# Altium footprint library ic.PcbLib: 129 footprints (part 2 of 9)
Each footprint in its own frame and in the unit in brackets; x right, y up, seen from the top. Pads: shape width x height; smd on the part's side, far side on the other; paste and mask are expansions set on the pad; w line width, h text height; cw(c..) or ccw(c..) is an arc to the next point about the centre after c.
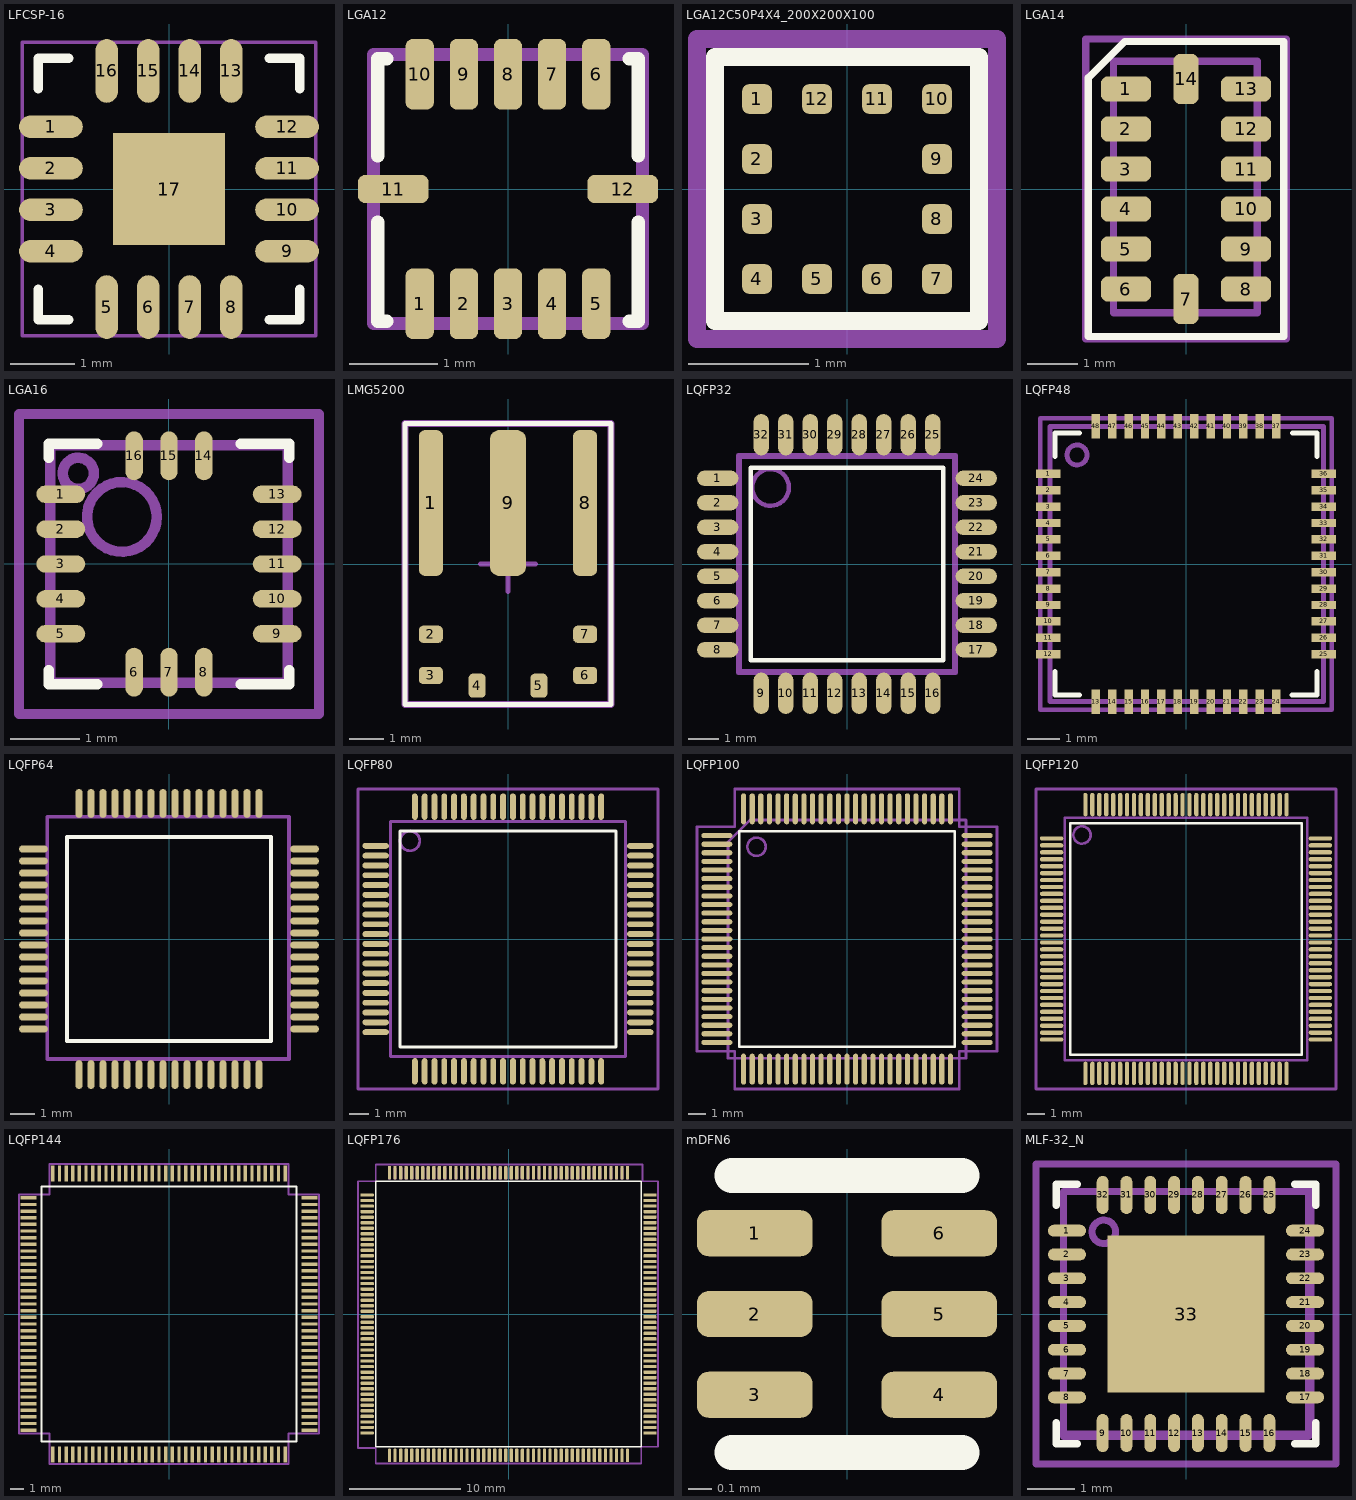
[diagram p1: the footprints below, top view; thin cyan lines are the x and y axes]

## LFCSP-16 [mm] "LFCSP, 16-Leads, Body 4,00x4,00mm, Pitch 0,65mm, Thermal Pad 1,75x1,75mm, IPC Medium Density"
height 1.5
pads (17):
  oval 1x0.35 smd: 1(-1.85,0.975) 2(-1.85,0.325) 3(-1.85,-0.325) 4(-1.85,-0.975) 9(1.85,-0.975) 10(1.85,-0.325) 11(1.85,0.325) 12(1.85,0.975)
  oval 0.35x1 smd: 5(-0.975,-1.85) 6(-0.325,-1.85) 7(0.325,-1.85) 8(0.975,-1.85) 13(0.975,1.85) 14(0.325,1.85) 15(-0.325,1.85) 16(-0.975,1.85)
  rect 1.75x1.75 smd: 17(0,0)
Top Overlay:
  lines w0.15: -2.05,-1.575 -2.05,-2.05 -1.575,-2.05 ; -2.05,1.575 -2.05,2.05 -1.575,2.05 ; 1.575,-2.05 2.05,-2.05 2.05,-1.575 ; 1.575,2.05 2.05,2.05 2.05,1.575
  text "." at -2.659,1.862 h0.1
Top Courtyard:
  lines w0.05: -2.3,-2.3 -2.3,2.3 2.3,2.3 2.3,-2.3 -2.3,-2.3
  lines w0.1: -0.5,0 0.5,0 ; 0,-0.5 0,0.5
3D body "LFCSP-16.step": height 1.5, standoff 0, extent -2.05,-2.05 2.05,2.05

## LGA12 [mm]
height 0.9
pads (12):
  rrect50% 0.32x0.8 smd: 1(-1,-1.3) 2(-0.5,-1.3) 3(0,-1.3) 4(0.5,-1.3) 5(1,-1.3) 6(1,1.3) 7(0.5,1.3) 8(0,1.3) 9(-0.5,1.3) 10(-1,1.3)
  rrect50% 0.8x0.32 smd: 11(-1.3,0) 12(1.3,0)
Top Overlay:
  lines w0.15: -1.475,-0.375 -1.475,-1.5 -1.375,-1.5 ; -1.475,0.375 -1.475,1.475 -1.375,1.475 ; 1.375,-1.5 1.475,-1.5 1.475,-0.375 ; 1.375,1.475 1.475,1.475 1.475,0.375
  text "." at -1.905,-1.359 h0.1
Top Courtyard:
  lines w0.15: -1.524,-1.524 -1.524,1.524 1.524,1.524 1.524,-1.524 -1.524,-1.524
3D body "LGA12.STEP": height 0.85, standoff 0, extent -1.5,-1.5 1.5,1.5

## LGA12C50P4X4_200X200X100 [mm] "LGA, 12-Leads, Body 2,00x2,00mmx1,00mm, Pitch 0,50mm"
height 1
pads (12):
  rrect50% 0.25x0.25 smd: 1(-0.75,0.75) 2(-0.75,0.25) 3(-0.75,-0.25) 4(-0.75,-0.75) 5(-0.25,-0.75) 6(0.25,-0.75) 7(0.75,-0.75) 8(0.75,-0.25) 9(0.75,0.25) 10(0.75,0.75) 11(0.25,0.75) 12(-0.25,0.75)
Top Overlay:
  lines w0.15: -1.1,-1.1 1.1,-1.1 1.1,1.1 -1.1,1.1 -1.1,-1.1
  text "." at -1.524,1.308 h0.1
Top Courtyard:
  lines w0.15: -1.25,-1.25 1.25,-1.25 1.25,1.25 -1.25,1.25 -1.25,-1.25
3D body "LGA12C50P4X4_200X200X100.step": height 1, standoff 0, extent -1.075,-1.075 1.075,1.075

## LGA14 [mm]
height 0.9
pads (14):
  rrect50% 1x0.5 smd: 1(-1.2,2) 2(-1.2,1.2) 3(-1.2,0.4) 4(-1.2,-0.4) 5(-1.2,-1.2) 6(-1.2,-2) 8(1.2,-2) 9(1.2,-1.2) 10(1.2,-0.4) 11(1.2,0.4) 12(1.2,1.2) 13(1.2,2)
  rrect50% 0.5x1 smd: 7(0,-2.2) 14(0,2.2)
Top Overlay:
  lines w0.15: -1.95,-2.95 1.95,-2.95 1.95,2.95 -1.225,2.95 -1.95,2.225 -1.95,-2.95
  text "." at -1.85,2.825 h0.1
Top Courtyard:
  lines w0.15: -2,-3 2,-3 2,3 -2,3 -2,-3
Mechanical 29:
  circle w0.15: c-0.925,2.025 r0.141
  lines w0.15: -1.45,-2.475 -1.45,2.55 1.425,2.55 1.425,-2.475 -1.45,-2.475
  text ".Designator" at 0.4,-2.3 h1
3D body "LGA14.STEP": height 1.1, standoff 0, extent -1.475,-2.5 1.525,2.5

## LGA16 [mm] "PQFN, 16-Leads, Body 3x3mm, Pitch 0.5mm, IPC Medium Density"
height 1
pads (16):
  oval 0.7x0.25 smd: 1(-1.55,1) 2(-1.55,0.5) 3(-1.55,0) 4(-1.55,-0.5) 5(-1.55,-1) 9(1.55,-1) 10(1.55,-0.5) 11(1.55,0) 12(1.55,0.5) 13(1.55,1)
  oval 0.25x0.7 smd: 6(-0.5,-1.55) 7(0,-1.55) 8(0.5,-1.55) 14(0.5,1.55) 15(0,1.55) 16(-0.5,1.55)
Top Overlay:
  lines w0.15: -1.725,-1.525 -1.725,-1.725 -1.025,-1.725 ; -1.725,1.525 -1.725,1.725 -1.025,1.725 ; 1.025,-1.725 1.725,-1.725 1.725,-1.525 ; 1.025,1.725 1.725,1.725 1.725,1.525
  text "." at -2.125,1.475 h0.1
Top Courtyard:
  lines w0.15: -2.15,-2.15 -2.15,2.15 2.15,2.15 2.15,-2.15 -2.15,-2.15
Mechanical 13:
  circle w0.15: c-0.675,0.675 r0.5
Mechanical 29:
  circle w0.15: c-1.3,1.3 r0.224
  lines w0.15: -1.7,-1.7 -1.7,1.7 1.7,1.7 1.7,-1.7 -1.7,-1.7
  text ".Designator" at -1.5,-0.5 h1
3D body: height 1, standoff 0, extent -1.575,-1.575 1.575,1.575

## LMG5200 [mm] "QFM 6?8 mm"
height 2
pads (9):
  rrect50% 0.7x4.25 smd: 1(-2.25,1.78) 8(2.25,1.78)
  rrect50% 0.7x0.5 smd: 2(-2.25,-2.05) 3(-2.25,-3.25) 6(2.25,-3.25) 7(2.25,-2.05)
  rrect50% 0.5x0.7 smd: 4(-0.9,-3.55) 5(0.9,-3.55)
  rrect50% 1.05x4.25 smd: 9(0,1.78)
Top Overlay:
  lines w0.15: -3,-4.1 0,-4.1 3,-4.1 3,0 3,4.1 0,4.1 -3,4.1 -3,0 -3,-4.1
  text "." at -2.775,4.55 h0.1
Top Courtyard:
  lines w0.15: -0.8,0 0,0 ; 0,-0.8 0,0 ; 0,0.8 0,0 ; 0.8,0 0,0 ; -3,-4.1 -3,4.1 3,4.1 3,-4.1 -3,-4.1
Mechanical 29:
  lines w0.2: -3,-4.1 0,-4.1 3,-4.1 3,0 3,4.1 0,4.1 -3,4.1 -3,0 -3,-4.1
  text ".Designator" at 0.3,-3.7 h1
3D body: height 2, standoff 0.05, extent -3,-4 3,4

## LQFP32 [mm] "TQFP, 32-Leads, Body 7,00x7,00mm, Pitch 0,80mm, IPC Medium Density"
height 1.5
pads (32):
  oval 1.35x0.5 smd: 1(-4.225,2.8) 2(-4.225,2) 3(-4.225,1.2) 4(-4.225,0.4) 5(-4.225,-0.4) 6(-4.225,-1.2) 7(-4.225,-2) 8(-4.225,-2.8) 17(4.225,-2.8) 18(4.225,-2) 19(4.225,-1.2) 20(4.225,-0.4) 21(4.225,0.4) 22(4.225,1.2) 23(4.225,2) 24(4.225,2.8)
  oval 0.5x1.35 smd: 9(-2.8,-4.225) 10(-2,-4.225) 11(-1.2,-4.225) 12(-0.4,-4.225) 13(0.4,-4.225) 14(1.2,-4.225) 15(2,-4.225) 16(2.8,-4.225) 25(2.8,4.225) 26(2,4.225) 27(1.2,4.225) 28(0.4,4.225) 29(-0.4,4.225) 30(-1.2,4.225) 31(-2,4.225) 32(-2.8,4.225)
Top Overlay:
  lines w0.15: -3.15,-3.15 3.15,-3.15 3.15,3.15 -3.15,3.15 -3.15,-3.15
  text "." at -5.08,3.467 h0.1
Top Courtyard:
  lines w0.15: -3.556,-3.556 3.556,-3.556 3.556,3.556 -3.556,3.556 -3.556,-3.556
Mechanical 29:
  circle w0.15: c-2.5,2.5 r0.6
  lines w0.15: -3.5,-3.5 -3.5,3.5 3.5,3.5 3.5,-3.5 -3.5,-3.5
  text ".Designator" at -2.7,-0.3 h1
3D body: height 1.5, standoff 0.1, extent -3.5,-3.5 3.5,3.5

## LQFP48 [mm]
pads (48):
  rect 0.75x0.254 smd: 1(-4.2,2.75) 2(-4.2,2.25) 3(-4.2,1.75) 4(-4.2,1.25) 5(-4.2,0.75) 6(-4.2,0.25) 7(-4.2,-0.25) 8(-4.2,-0.75) 9(-4.2,-1.25) 10(-4.2,-1.75) 11(-4.2,-2.25) 12(-4.2,-2.75) 25(4.2,-2.75) 26(4.2,-2.25) 27(4.2,-1.75) 28(4.2,-1.25) 29(4.2,-0.75) 30(4.2,-0.25) 31(4.2,0.25) 32(4.2,0.75) 33(4.2,1.25) 34(4.2,1.75) 35(4.2,2.25) 36(4.2,2.75)
  rect 0.254x0.75 smd: 13(-2.75,-4.2) 14(-2.25,-4.2) 15(-1.75,-4.2) 16(-1.25,-4.2) 17(-0.75,-4.2) 18(-0.25,-4.2) 19(0.25,-4.2) 20(0.75,-4.2) 21(1.25,-4.2) 22(1.75,-4.2) 23(2.25,-4.2) 24(2.75,-4.2) 37(2.75,4.2) 38(2.25,4.2) 39(1.75,4.2) 40(1.25,4.2) 41(0.75,4.2) 42(0.25,4.2) 43(-0.25,4.2) 44(-0.75,4.2) 45(-1.25,4.2) 46(-1.75,4.2) 47(-2.25,4.2) 48(-2.75,4.2)
Top Overlay:
  lines w0.15: -4,-3.275 -4,-4 -3.25,-4 ; -4,3.275 -4,4 -3.25,4 ; 3.225,-4 4,-4 4,-3.275 ; 3.25,4 4,4 4,3.275
  text "." at -4.7,3.6 h0.1
Top Courtyard:
  lines w0.15: -4.445,-4.445 -4.445,4.445 4.445,4.445 4.445,-4.445 -4.445,-4.445
Mechanical 29:
  circle w0.15: c-3.325,3.325 r0.305
  lines w0.15: -4.15,-4.2 -4.15,4.2 4.2,4.2 4.2,-4.2 -4.15,-4.2
  text ".Designator" at -3.1,-0.2 h1
3D body "User Library-Quad50M48.step": height 1.56, standoff 0, extent -4.5,-4.511 4.5,4.489

## LQFP64 [mm]
height 1.6
pads (64):
  oval 1.2x0.3 smd: 1(-5.65,3.75) 2(-5.65,3.25) 3(-5.65,2.75) 4(-5.65,2.25) 5(-5.65,1.75) 6(-5.65,1.25) 7(-5.65,0.75) 8(-5.65,0.25) 9(-5.65,-0.25) 10(-5.65,-0.75) 11(-5.65,-1.25) 12(-5.65,-1.75) 13(-5.65,-2.25) 14(-5.65,-2.75) 15(-5.65,-3.25) 16(-5.65,-3.75) 33(5.65,-3.75) 34(5.65,-3.25) 35(5.65,-2.75) 36(5.65,-2.25) 37(5.65,-1.75) 38(5.65,-1.25) 39(5.65,-0.75) 40(5.65,-0.25) 41(5.65,0.25) 42(5.65,0.75) 43(5.65,1.25) 44(5.65,1.75) 45(5.65,2.25) 46(5.65,2.75) 47(5.65,3.25) 48(5.65,3.75)
  oval 0.3x1.2 smd: 17(-3.75,-5.65) 18(-3.25,-5.65) 19(-2.75,-5.65) 20(-2.25,-5.65) 21(-1.75,-5.65) 22(-1.25,-5.65) 23(-0.75,-5.65) 24(-0.25,-5.65) 25(0.25,-5.65) 26(0.75,-5.65) 27(1.25,-5.65) 28(1.75,-5.65) 29(2.25,-5.65) 30(2.75,-5.65) 31(3.25,-5.65) 32(3.75,-5.65) 49(3.75,5.65) 50(3.25,5.65) 51(2.75,5.65) 52(2.25,5.65) 53(1.75,5.65) 54(1.25,5.65) 55(0.75,5.65) 56(0.25,5.65) 57(-0.25,5.65) 58(-0.75,5.65) 59(-1.25,5.65) 60(-1.75,5.65) 61(-2.25,5.65) 62(-2.75,5.65) 63(-3.25,5.65) 64(-3.75,5.65)
Top Overlay:
  lines w0.15: -4.25,-4.25 -4.25,4.25 4.25,4.25 4.25,-4.25 -4.25,-4.25
  text "." at -6.096,4.356 h0.1
Top Courtyard:
  lines w0.15: -5.08,-5 -5.08,5.1 5,5.1 5,-5 -5.08,-5
3D body "User Library-LQFP64-1.step": height 1.56, standoff 0, extent -6,-6 6,6

## LQFP80 [mm] "TSQFP, 80-Leads, Body 12,00x12,00mm, Pitch 0,50mm, IPC Medium Density"
height 1.5
pads (80):
  oval 1.35x0.3 smd: 1(-6.75,4.75) 2(-6.75,4.25) 3(-6.75,3.75) 4(-6.75,3.25) 5(-6.75,2.75) 6(-6.75,2.25) 7(-6.75,1.75) 8(-6.75,1.25) 9(-6.75,0.75) 10(-6.75,0.25) 11(-6.75,-0.25) 12(-6.75,-0.75) 13(-6.75,-1.25) 14(-6.75,-1.75) 15(-6.75,-2.25) 16(-6.75,-2.75) 17(-6.75,-3.25) 18(-6.75,-3.75) 19(-6.75,-4.25) 20(-6.75,-4.75) 41(6.75,-4.75) 42(6.75,-4.25) 43(6.75,-3.75) 44(6.75,-3.25) 45(6.75,-2.75) 46(6.75,-2.25) 47(6.75,-1.75) 48(6.75,-1.25) 49(6.75,-0.75) 50(6.75,-0.25) 51(6.75,0.25) 52(6.75,0.75) 53(6.75,1.25) 54(6.75,1.75) 55(6.75,2.25) 56(6.75,2.75) 57(6.75,3.25) 58(6.75,3.75) 59(6.75,4.25) 60(6.75,4.75)
  oval 0.3x1.35 smd: 21(-4.75,-6.75) 22(-4.25,-6.75) 23(-3.75,-6.75) 24(-3.25,-6.75) 25(-2.75,-6.75) 26(-2.25,-6.75) 27(-1.75,-6.75) 28(-1.25,-6.75) 29(-0.75,-6.75) 30(-0.25,-6.75) 31(0.25,-6.75) 32(0.75,-6.75) 33(1.25,-6.75) 34(1.75,-6.75) 35(2.25,-6.75) 36(2.75,-6.75) 37(3.25,-6.75) 38(3.75,-6.75) 39(4.25,-6.75) 40(4.75,-6.75) 61(4.75,6.75) 62(4.25,6.75) 63(3.75,6.75) 64(3.25,6.75) 65(2.75,6.75) 66(2.25,6.75) 67(1.75,6.75) 68(1.25,6.75) 69(0.75,6.75) 70(0.25,6.75) 71(-0.25,6.75) 72(-0.75,6.75) 73(-1.25,6.75) 74(-1.75,6.75) 75(-2.25,6.75) 76(-2.75,6.75) 77(-3.25,6.75) 78(-3.75,6.75) 79(-4.25,6.75) 80(-4.75,6.75)
Top Overlay:
  lines w0.15: -5.5,-5.5 5.5,-5.5 5.5,5.5 -5.5,5.5 -5.5,-5.5
  text "." at -7,5.3 h0.1
Top Courtyard:
  lines w0.15: -7.65,-7.65 7.65,-7.65 7.65,7.65 -7.65,7.65 -7.65,-7.65
Mechanical 29:
  circle w0.15: c-5,5 r0.5
  lines w0.15: -6,-6 6,-6 6,6 -6,6 -6,-6
  text ".Designator" at -3.4,-0.2 h1
3D body: height 1.5, standoff 0.1, extent -6,-6 6,6

## LQFP100 [mm] "Thin QFP, 100-Leads, Body 14x14mm, Pitch 0.5mm, IPC Medium Density"
height 1.6
pads (100):
  oval 1.8x0.3 smd: 1(-7.55,6) 2(-7.55,5.5) 3(-7.55,5) 4(-7.55,4.5) 5(-7.55,4) 6(-7.55,3.5) 7(-7.55,3) 8(-7.55,2.5) 9(-7.55,2) 10(-7.55,1.5) 11(-7.55,1) 12(-7.55,0.5) 13(-7.55,0) 14(-7.55,-0.5) 15(-7.55,-1) 16(-7.55,-1.5) 17(-7.55,-2) 18(-7.55,-2.5) 19(-7.55,-3) 20(-7.55,-3.5) 21(-7.55,-4) 22(-7.55,-4.5) 23(-7.55,-5) 24(-7.55,-5.5) 25(-7.55,-6) 51(7.55,-6) 52(7.55,-5.5) 53(7.55,-5) 54(7.55,-4.5) 55(7.55,-4) 56(7.55,-3.5) 57(7.55,-3) 58(7.55,-2.5) 59(7.55,-2) 60(7.55,-1.5) 61(7.55,-1) 62(7.55,-0.5) 63(7.55,0) 64(7.55,0.5) 65(7.55,1) 66(7.55,1.5) 67(7.55,2) 68(7.55,2.5) 69(7.55,3) 70(7.55,3.5) 71(7.55,4) 72(7.55,4.5) 73(7.55,5) 74(7.55,5.5) 75(7.55,6)
  oval 0.3x1.8 smd: 26(-6,-7.55) 27(-5.5,-7.55) 28(-5,-7.55) 29(-4.5,-7.55) 30(-4,-7.55) 31(-3.5,-7.55) 32(-3,-7.55) 33(-2.5,-7.55) 34(-2,-7.55) 35(-1.5,-7.55) 36(-1,-7.55) 37(-0.5,-7.55) 38(0,-7.55) 39(0.5,-7.55) 40(1,-7.55) 41(1.5,-7.55) 42(2,-7.55) 43(2.5,-7.55) 44(3,-7.55) 45(3.5,-7.55) 46(4,-7.55) 47(4.5,-7.55) 48(5,-7.55) 49(5.5,-7.55) 50(6,-7.55) 76(6,7.55) 77(5.5,7.55) 78(5,7.55) 79(4.5,7.55) 80(4,7.55) 81(3.5,7.55) 82(3,7.55) 83(2.5,7.55) 84(2,7.55) 85(1.5,7.55) 86(1,7.55) 87(0.5,7.55) 88(0,7.55) 89(-0.5,7.55) 90(-1,7.55) 91(-1.5,7.55) 92(-2,7.55) 93(-2.5,7.55) 94(-3,7.55) 95(-3.5,7.55) 96(-4,7.55) 97(-4.5,7.55) 98(-5,7.55) 99(-5.5,7.55) 100(-6,7.55)
Top Overlay:
  lines w0.15: -6.25,-6.25 -6.25,6.25 6.25,6.25 6.25,-6.25 -6.25,-6.25
  text "." at -8.645,6.557 h0.1
Top Courtyard:
  lines w0.15: -8.7,-6.5 -6.5,-6.5 -6.5,-8.7 6.5,-8.7 6.5,-6.5 8.7,-6.5 8.7,6.5 6.5,6.5 6.5,8.7 -6.5,8.7 -6.5,6.5 -8.7,6.5 -8.7,-6.5
Mechanical 29:
  circle w0.15: c-5.25,5.35 r0.53
  lines w0.15: -6.9,-6.925 -6.9,5.625 -5.625,6.9 6.9,6.9 6.9,-6.925 -6.9,-6.925
  text ".Designator" at -3.2,-0.3 h1
3D body "User Library-LQFP100_Grid_0_5.STEP": height 1.6, standoff 0, extent -8,-8 8,8

## LQFP120 [mm] "TSQFP, 120-Leads, Body 14,00x14,00mm, Pitch 0,40mm, IPC Medium Density"
height 1.5
pads (120):
  oval 1.35x0.25 smd: 1(-7.75,5.8) 2(-7.75,5.4) 3(-7.75,5) 4(-7.75,4.6) 5(-7.75,4.2) 6(-7.75,3.8) 7(-7.75,3.4) 8(-7.75,3) 9(-7.75,2.6) 10(-7.75,2.2) 11(-7.75,1.8) 12(-7.75,1.4) 13(-7.75,1) 14(-7.75,0.6) 15(-7.75,0.2) 16(-7.75,-0.2) 17(-7.75,-0.6) 18(-7.75,-1) 19(-7.75,-1.4) 20(-7.75,-1.8) 21(-7.75,-2.2) 22(-7.75,-2.6) 23(-7.75,-3) 24(-7.75,-3.4) 25(-7.75,-3.8) 26(-7.75,-4.2) 27(-7.75,-4.6) 28(-7.75,-5) 29(-7.75,-5.4) 30(-7.75,-5.8) 61(7.75,-5.8) 62(7.75,-5.4) 63(7.75,-5) 64(7.75,-4.6) 65(7.75,-4.2) 66(7.75,-3.8) 67(7.75,-3.4) 68(7.75,-3) 69(7.75,-2.6) 70(7.75,-2.2) 71(7.75,-1.8) 72(7.75,-1.4) 73(7.75,-1) 74(7.75,-0.6) 75(7.75,-0.2) 76(7.75,0.2) 77(7.75,0.6) 78(7.75,1) 79(7.75,1.4) 80(7.75,1.8) 81(7.75,2.2) 82(7.75,2.6) 83(7.75,3) 84(7.75,3.4) 85(7.75,3.8) 86(7.75,4.2) 87(7.75,4.6) 88(7.75,5) 89(7.75,5.4) 90(7.75,5.8)
  oval 0.25x1.35 smd: 31(-5.8,-7.75) 32(-5.4,-7.75) 33(-5,-7.75) 34(-4.6,-7.75) 35(-4.2,-7.75) 36(-3.8,-7.75) 37(-3.4,-7.75) 38(-3,-7.75) 39(-2.6,-7.75) 40(-2.2,-7.75) 41(-1.8,-7.75) 42(-1.4,-7.75) 43(-1,-7.75) 44(-0.6,-7.75) 45(-0.2,-7.75) 46(0.2,-7.75) 47(0.6,-7.75) 48(1,-7.75) 49(1.4,-7.75) 50(1.8,-7.75) 51(2.2,-7.75) 52(2.6,-7.75) 53(3,-7.75) 54(3.4,-7.75) 55(3.8,-7.75) 56(4.2,-7.75) 57(4.6,-7.75) 58(5,-7.75) 59(5.4,-7.75) 60(5.8,-7.75) 91(5.8,7.75) 92(5.4,7.75) 93(5,7.75) 94(4.6,7.75) 95(4.2,7.75) 96(3.8,7.75) 97(3.4,7.75) 98(3,7.75) 99(2.6,7.75) 100(2.2,7.75) 101(1.8,7.75) 102(1.4,7.75) 103(1,7.75) 104(0.6,7.75) 105(0.2,7.75) 106(-0.2,7.75) 107(-0.6,7.75) 108(-1,7.75) 109(-1.4,7.75) 110(-1.8,7.75) 111(-2.2,7.75) 112(-2.6,7.75) 113(-3,7.75) 114(-3.4,7.75) 115(-3.8,7.75) 116(-4.2,7.75) 117(-4.6,7.75) 118(-5,7.75) 119(-5.4,7.75) 120(-5.8,7.75)
Top Overlay:
  lines w0.15: -6.675,-6.675 -6.675,6.675 6.675,6.675 6.675,-6.675 -6.675,-6.675
  text "." at -7.9,6.4 h0.1
Top Courtyard:
  lines w0.15: -8.65,-8.65 -8.65,8.65 8.65,8.65 8.65,-8.65 -8.65,-8.65
Mechanical 29:
  circle w0.15: c-6,6 r0.5
  lines w0.15: -7,-7 7,-7 7,7 -7,7 -7,-7
  text ".Designator" at -3.4,-0.4 h1
3D body: height 1.5, standoff 0.1, extent -7,-7 7,7

## LQFP144 [mm] "TSQFP, 144-Leads, Body 20,00x20,00mm, Pitch 0,50mm, IPC High Density"
height 1.6
pads (144):
  rect 1.2x0.25 smd: 1(-10.6,8.75) 2(-10.6,8.25) 3(-10.6,7.75) 4(-10.6,7.25) 5(-10.6,6.75) 6(-10.6,6.25) 7(-10.6,5.75) 8(-10.6,5.25) 9(-10.6,4.75) 10(-10.6,4.25) 11(-10.6,3.75) 12(-10.6,3.25) 13(-10.6,2.75) 14(-10.6,2.25) 15(-10.6,1.75) 16(-10.6,1.25) 17(-10.6,0.75) 18(-10.6,0.25) 19(-10.6,-0.25) 20(-10.6,-0.75) 21(-10.6,-1.25) 22(-10.6,-1.75) 23(-10.6,-2.25) 24(-10.6,-2.75) 25(-10.6,-3.25) 26(-10.6,-3.75) 27(-10.6,-4.25) 28(-10.6,-4.75) 29(-10.6,-5.25) 30(-10.6,-5.75) 31(-10.6,-6.25) 32(-10.6,-6.75) 33(-10.6,-7.25) 34(-10.6,-7.75) 35(-10.6,-8.25) 36(-10.6,-8.75) 73(10.6,-8.75) 74(10.6,-8.25) 75(10.6,-7.75) 76(10.6,-7.25) 77(10.6,-6.75) 78(10.6,-6.25) 79(10.6,-5.75) 80(10.6,-5.25) 81(10.6,-4.75) 82(10.6,-4.25) 83(10.6,-3.75) 84(10.6,-3.25) 85(10.6,-2.75) 86(10.6,-2.25) 87(10.6,-1.75) 88(10.6,-1.25) 89(10.6,-0.75) 90(10.6,-0.25) 91(10.6,0.25) 92(10.6,0.75) 93(10.6,1.25) 94(10.6,1.75) 95(10.6,2.25) 96(10.6,2.75) 97(10.6,3.25) 98(10.6,3.75) 99(10.6,4.25) 100(10.6,4.75) 101(10.6,5.25) 102(10.6,5.75) 103(10.6,6.25) 104(10.6,6.75) 105(10.6,7.25) 106(10.6,7.75) 107(10.6,8.25) 108(10.6,8.75)
  rect 0.25x1.2 smd: 37(-8.75,-10.6) 38(-8.25,-10.6) 39(-7.75,-10.6) 40(-7.25,-10.6) 41(-6.75,-10.6) 42(-6.25,-10.6) 43(-5.75,-10.6) 44(-5.25,-10.6) 45(-4.75,-10.6) 46(-4.25,-10.6) 47(-3.75,-10.6) 48(-3.25,-10.6) 49(-2.75,-10.6) 50(-2.25,-10.6) 51(-1.75,-10.6) 52(-1.25,-10.6) 53(-0.75,-10.6) 54(-0.25,-10.6) 55(0.25,-10.6) 56(0.75,-10.6) 57(1.25,-10.6) 58(1.75,-10.6) 59(2.25,-10.6) 60(2.75,-10.6) 61(3.25,-10.6) 62(3.75,-10.6) 63(4.25,-10.6) 64(4.75,-10.6) 65(5.25,-10.6) 66(5.75,-10.6) 67(6.25,-10.6) 68(6.75,-10.6) 69(7.25,-10.6) 70(7.75,-10.6) 71(8.25,-10.6) 72(8.75,-10.6) 109(8.75,10.6) 110(8.25,10.6) 111(7.75,10.6) 112(7.25,10.6) 113(6.75,10.6) 114(6.25,10.6) 115(5.75,10.6) 116(5.25,10.6) 117(4.75,10.6) 118(4.25,10.6) 119(3.75,10.6) 120(3.25,10.6) 121(2.75,10.6) 122(2.25,10.6) 123(1.75,10.6) 124(1.25,10.6) 125(0.75,10.6) 126(0.25,10.6) 127(-0.25,10.6) 128(-0.75,10.6) 129(-1.25,10.6) 130(-1.75,10.6) 131(-2.25,10.6) 132(-2.75,10.6) 133(-3.25,10.6) 134(-3.75,10.6) 135(-4.25,10.6) 136(-4.75,10.6) 137(-5.25,10.6) 138(-5.75,10.6) 139(-6.25,10.6) 140(-6.75,10.6) 141(-7.25,10.6) 142(-7.75,10.6) 143(-8.25,10.6) 144(-8.75,10.6)
Top Overlay:
  lines w0.15: -9.6,-9.6 -9.6,9.6 9.6,9.6 9.6,-9.6 -9.6,-9.6
  text "." at -10.495,9.525 h0.1
Top Courtyard:
  lines w0.15: -11.3,-9 -11.3,9 -9,9 -9,11.3 9,11.3 9,9 11.3,9 11.3,-9 9,-9 9,-11.3 -9,-11.3 -9,-9 -11.3,-9
3D body "LQFP144.step": height 1.6, standoff 0, extent -11,-11 11,11

## LQFP176 [mm] "LQFP176, 24 x 24 mm, 176-pin low-profile quad flat package  recommended footprint"
height 1.14
pads (176):
  rrect50% 1.2x0.3 smd: 1(-12.77,10.75) 2(-12.77,10.25) 3(-12.77,9.75) 4(-12.77,9.25) 5(-12.77,8.75) 6(-12.77,8.25) 7(-12.77,7.75) 8(-12.77,7.25) 9(-12.77,6.75) 10(-12.77,6.25) 11(-12.77,5.75) 12(-12.77,5.25) 13(-12.77,4.75) 14(-12.77,4.25) 15(-12.77,3.75) 16(-12.77,3.25) 17(-12.77,2.75) 18(-12.77,2.25) 19(-12.77,1.75) 20(-12.77,1.25) 21(-12.77,0.75) 22(-12.77,0.25) 23(-12.77,-0.25) 24(-12.77,-0.75) 25(-12.77,-1.25) 26(-12.77,-1.75) 27(-12.77,-2.25) 28(-12.77,-2.75) 29(-12.77,-3.25) 30(-12.77,-3.75) 31(-12.77,-4.25) 32(-12.77,-4.75) 33(-12.77,-5.25) 34(-12.77,-5.75) 35(-12.77,-6.25) 36(-12.77,-6.75) 37(-12.77,-7.25) 38(-12.77,-7.75) 39(-12.77,-8.25) 40(-12.77,-8.75) 41(-12.77,-9.25) 42(-12.77,-9.75) 43(-12.77,-10.25) 44(-12.77,-10.75) 89(12.77,-10.75) 90(12.77,-10.25) 91(12.77,-9.75) 92(12.77,-9.25) 93(12.77,-8.75) 94(12.77,-8.25) 95(12.77,-7.75) 96(12.77,-7.25) 97(12.77,-6.75) 98(12.77,-6.25) 99(12.77,-5.75) 100(12.77,-5.25) 101(12.77,-4.75) 102(12.77,-4.25) 103(12.77,-3.75) 104(12.77,-3.25) 105(12.77,-2.75) 106(12.77,-2.25) 107(12.77,-1.75) 108(12.77,-1.25) 109(12.77,-0.75) 110(12.77,-0.25) 111(12.77,0.25) 112(12.77,0.75) 113(12.77,1.25) 114(12.77,1.75) 115(12.77,2.25) 116(12.77,2.75) 117(12.77,3.25) 118(12.77,3.75) 119(12.77,4.25) 120(12.77,4.75) 121(12.77,5.25) 122(12.77,5.75) 123(12.77,6.25) 124(12.77,6.75) 125(12.77,7.25) 126(12.77,7.75) 127(12.77,8.25) 128(12.77,8.75) 129(12.77,9.25) 130(12.77,9.75) 131(12.77,10.25) 132(12.77,10.75)
  rrect50% 0.3x1.2 smd: 45(-10.75,-12.77) 46(-10.25,-12.77) 47(-9.75,-12.77) 48(-9.25,-12.77) 49(-8.75,-12.77) 50(-8.25,-12.77) 51(-7.75,-12.77) 52(-7.25,-12.77) 53(-6.75,-12.77) 54(-6.25,-12.77) 55(-5.75,-12.77) 56(-5.25,-12.77) 57(-4.75,-12.77) 58(-4.25,-12.77) 59(-3.75,-12.77) 60(-3.25,-12.77) 61(-2.75,-12.77) 62(-2.25,-12.77) 63(-1.75,-12.77) 64(-1.25,-12.77) 65(-0.75,-12.77) 66(-0.25,-12.77) 67(0.25,-12.77) 68(0.75,-12.77) 69(1.25,-12.77) 70(1.75,-12.77) 71(2.25,-12.77) 72(2.75,-12.77) 73(3.25,-12.77) 74(3.75,-12.77) 75(4.25,-12.77) 76(4.75,-12.77) 77(5.25,-12.77) 78(5.75,-12.77) 79(6.25,-12.77) 80(6.75,-12.77) 81(7.25,-12.77) 82(7.75,-12.77) 83(8.25,-12.77) 84(8.75,-12.77) 85(9.25,-12.77) 86(9.75,-12.77) 87(10.25,-12.77) 88(10.75,-12.77) 133(10.75,12.77) 134(10.25,12.77) 135(9.75,12.77) 136(9.25,12.77) 137(8.75,12.77) 138(8.25,12.77) 139(7.75,12.77) 140(7.25,12.77) 141(6.75,12.77) 142(6.25,12.77) 143(5.75,12.77) 144(5.25,12.77) 145(4.75,12.77) 146(4.25,12.77) 147(3.75,12.77) 148(3.25,12.77) 149(2.75,12.77) 150(2.25,12.77) 151(1.75,12.77) 152(1.25,12.77) 153(0.75,12.77) 154(0.25,12.77) 155(-0.25,12.77) 156(-0.75,12.77) 157(-1.25,12.77) 158(-1.75,12.77) 159(-2.25,12.77) 160(-2.75,12.77) 161(-3.25,12.77) 162(-3.75,12.77) 163(-4.25,12.77) 164(-4.75,12.77) 165(-5.25,12.77) 166(-5.75,12.77) 167(-6.25,12.77) 168(-6.75,12.77) 169(-7.25,12.77) 170(-7.75,12.77) 171(-8.25,12.77) 172(-8.75,12.77) 173(-9.25,12.77) 174(-9.75,12.77) 175(-10.25,12.77) 176(-10.75,12.77)
Top Overlay:
  lines w0.152: -12,-12 12,-12 12,12 -12,12 -12,-12
  text "." at -12.9,11.5 h0.1
Top Courtyard:
  lines w0.15: -13.6,-12.1 -13.6,12 -12,12 -12,13.5 12.1,13.5 12.1,12 13.5,12 13.5,-12 12,-12 12,-13.5 -12,-13.5 -12,-12.1 -13.6,-12.1
Bottom Courtyard:
  region: 10.6,13.17 10.6,12.17 10.9,12.17 10.9,13.17
  region: 7.6,13.17 7.6,12.17 7.9,12.17 7.9,13.17
  region: 8.1,13.17 8.1,12.17 8.4,12.17 8.4,13.17
  region: 8.6,13.17 8.6,12.17 8.9,12.17 8.9,13.17
  region: 10.1,13.17 10.1,12.17 10.4,12.17 10.4,13.17
  region: 9.6,13.17 9.6,12.17 9.9,12.17 9.9,13.17
  region: 9.1,13.17 9.1,12.17 9.4,12.17 9.4,13.17
  region: 4.6,13.17 4.6,12.17 4.9,12.17 4.9,13.17
  region: 5.1,13.17 5.1,12.17 5.4,12.17 5.4,13.17
  region: 5.6,13.17 5.6,12.17 5.9,12.17 5.9,13.17
  region: 7.1,13.17 7.1,12.17 7.4,12.17 7.4,13.17
  region: 6.6,13.17 6.6,12.17 6.9,12.17 6.9,13.17
  region: 6.1,13.17 6.1,12.17 6.4,12.17 6.4,13.17
  region: 1.6,13.17 1.6,12.17 1.9,12.17 1.9,13.17
  region: 2.1,13.17 2.1,12.17 2.4,12.17 2.4,13.17
  region: 2.6,13.17 2.6,12.17 2.9,12.17 2.9,13.17
  region: 4.1,13.17 4.1,12.17 4.4,12.17 4.4,13.17
  region: 3.6,13.17 3.6,12.17 3.9,12.17 3.9,13.17
  region: 3.1,13.17 3.1,12.17 3.4,12.17 3.4,13.17
  region: -1.4,13.17 -1.4,12.17 -1.1,12.17 -1.1,13.17
  region: -0.9,13.17 -0.9,12.17 -0.6,12.17 -0.6,13.17
  region: -0.4,13.17 -0.4,12.17 -0.1,12.17 -0.1,13.17
  region: 1.1,13.17 1.1,12.17 1.4,12.17 1.4,13.17
  region: 0.6,13.17 0.6,12.17 0.9,12.17 0.9,13.17
  region: 0.1,13.17 0.1,12.17 0.4,12.17 0.4,13.17
  region: -4.4,13.17 -4.4,12.17 -4.1,12.17 -4.1,13.17
  region: -3.9,13.17 -3.9,12.17 -3.6,12.17 -3.6,13.17
  region: -3.4,13.17 -3.4,12.17 -3.1,12.17 -3.1,13.17
  region: -1.9,13.17 -1.9,12.17 -1.6,12.17 -1.6,13.17
  region: -2.4,13.17 -2.4,12.17 -2.1,12.17 -2.1,13.17
  region: -2.9,13.17 -2.9,12.17 -2.6,12.17 -2.6,13.17
  region: -7.4,13.17 -7.4,12.17 -7.1,12.17 -7.1,13.17
  region: -6.9,13.17 -6.9,12.17 -6.6,12.17 -6.6,13.17
  region: -6.4,13.17 -6.4,12.17 -6.1,12.17 -6.1,13.17
  region: -4.9,13.17 -4.9,12.17 -4.6,12.17 -4.6,13.17
  region: -5.4,13.17 -5.4,12.17 -5.1,12.17 -5.1,13.17
  region: -5.9,13.17 -5.9,12.17 -5.6,12.17 -5.6,13.17
  region: -8.9,13.17 -8.9,12.17 -8.6,12.17 -8.6,13.17
  region: -8.4,13.17 -8.4,12.17 -8.1,12.17 -8.1,13.17
  region: -7.9,13.17 -7.9,12.17 -7.6,12.17 -7.6,13.17
  region: -9.4,13.17 -9.4,12.17 -9.1,12.17 -9.1,13.17
  region: -9.9,13.17 -9.9,12.17 -9.6,12.17 -9.6,13.17
  region: -10.9,13.17 -10.9,12.17 -10.6,12.17 -10.6,13.17
  region: -10.4,13.17 -10.4,12.17 -10.1,12.17 -10.1,13.17
3D body "User Library-LQFP176-0_5.STEP": height 1.56, standoff -0.01, extent -12.886,-12.886 12.886,12.886

## mDFN6 [mm]
pads (6):
  rrect50% 0.5x0.2 smd: 1(-0.4,0.35) 2(-0.4,0) 3(-0.4,-0.35) 4(0.4,-0.35) 5(0.4,0) 6(0.4,0.35)
Top Overlay:
  lines w0.15: -0.5,-0.6 0.5,-0.6 ; -0.5,0.6 0.5,0.6
  text "." at -0.855,0.759 h0.1
3D body: height 0.5, standoff 0, extent -0.5,-0.5 0.5,0.5

## MLF-32_N [mm] "QFN, 32-Leads, Body 5x5mm, Pitch 0.5mm, Thermal Pad 3.3x3.3mm, IPC Medium Density"
height 1
pads (33):
  oval 0.8x0.25 smd: 1(-2.5,1.75) 2(-2.5,1.25) 3(-2.5,0.75) 4(-2.5,0.25) 5(-2.5,-0.25) 6(-2.5,-0.75) 7(-2.5,-1.25) 8(-2.5,-1.75) 17(2.5,-1.75) 18(2.5,-1.25) 19(2.5,-0.75) 20(2.5,-0.25) 21(2.5,0.25) 22(2.5,0.75) 23(2.5,1.25) 24(2.5,1.75)
  oval 0.25x0.8 smd: 9(-1.75,-2.5) 10(-1.25,-2.5) 11(-0.75,-2.5) 12(-0.25,-2.5) 13(0.25,-2.5) 14(0.75,-2.5) 15(1.25,-2.5) 16(1.75,-2.5) 25(1.75,2.5) 26(1.25,2.5) 27(0.75,2.5) 28(0.25,2.5) 29(-0.25,2.5) 30(-0.75,2.5) 31(-1.25,2.5) 32(-1.75,2.5)
  rect 3.3x3.3 smd: 33(0,0)
Top Overlay:
  lines w0.15: -2.725,-2.275 -2.725,-2.725 -2.275,-2.725 ; -2.725,2.275 -2.725,2.725 -2.275,2.725 ; 2.275,-2.725 2.725,-2.725 2.725,-2.275 ; 2.275,2.725 2.725,2.725 2.725,2.275
  text "." at -3.111,2.242 h0.1
Top Courtyard:
  lines w0.15: -3.15,-3.15 -3.15,3.15 3.15,3.15 3.15,-3.15 -3.15,-3.15
Mechanical 29:
  circle w0.15: c-1.725,1.725 r0.247
  lines w0.15: -2.575,2.575 -2.575,-2.575 2.575,-2.575 2.575,2.575 -2.575,2.575 ; -2.575,2.575 -2.575,-2.525 2.625,-2.525 2.625,2.575 -2.575,2.575
  text ".Designator" at -2.3,-0.3 h1
3D body "User Library-MLF-32.step": height 0.85, standoff 0, extent -2.51,-2.51 2.51,2.51